# Altium footprint library CADTcommon.PcbLib: 503 footprints (part 17 of 32)
Each footprint in its own frame and in the unit in brackets; x right, y up, seen from the top. Pads: shape width x height; smd on the part's side, far side on the other; paste and mask are expansions set on the pad; w line width, h text height; cw(c..) or ccw(c..) is an arc to the next point about the centre after c.
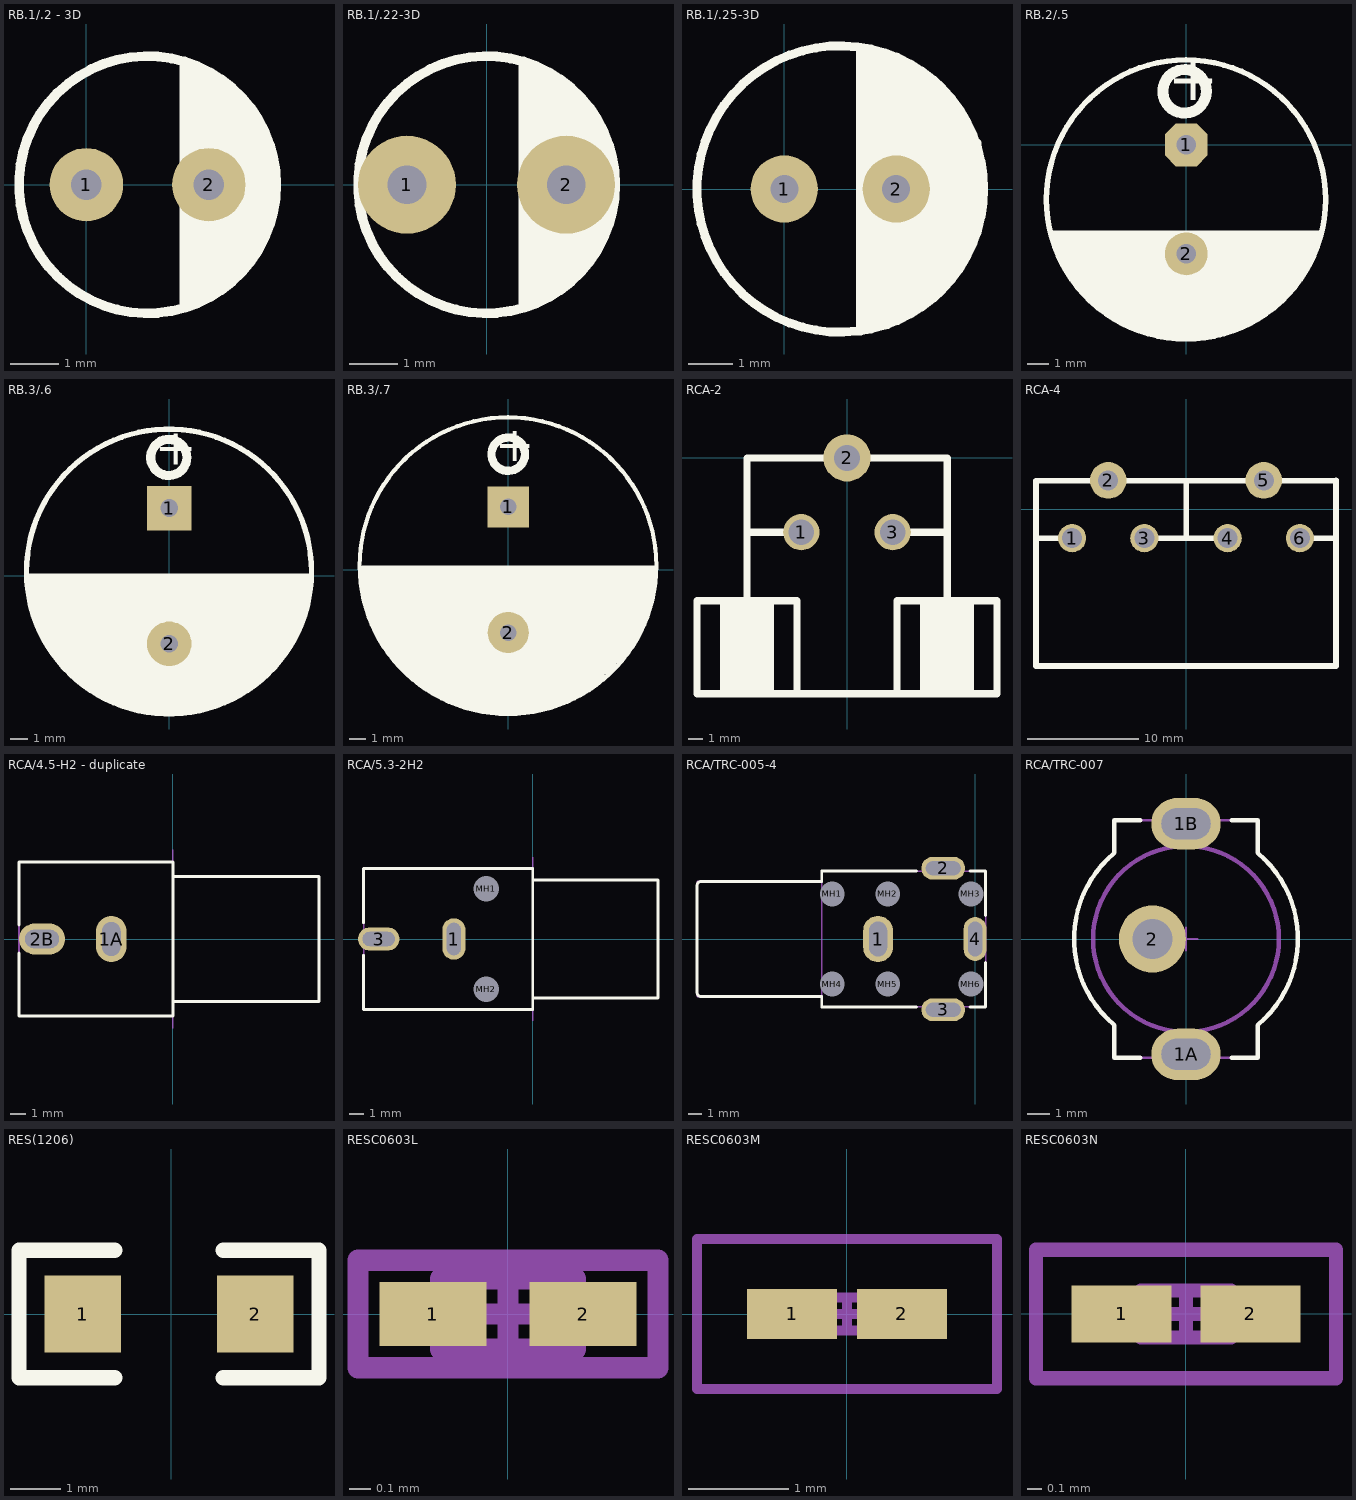
[diagram p16: the footprints below, top view; thin cyan lines are the x and y axes]

## RB.1/.2 - 3D [mil]
pads (2):
  round 60 hole 25: 1(0,0) 2(100,0)
Top Overlay:
  circle w8: c50,0 r105
  lines w8: 80,-100 80,100 ; 85,-95 85,95 ; 90,-90 90,95 ; 95,-90 95,90 ; 100,-90 100,85 ; 100,-85 110,-85 ; 105,-80 105,80 ; 105,85 110,80 110,-80 ; 115,-75 115,75 ; 120,-70 120,70 ; 125,-65 125,65 ; 130,-60 130,65 ; 130,-55 135,-55 ; 135,-50 135,50 135,55 ; 140,-45 140,45 ; 145,-35 145,35 ; 150,-25 150,20
Bottom Overlay:
  lines w8: 70,0 75,0
3D body: height 453.76, standoff -128.81, extent -50.43,-99 148.43,99.85

## RB.1/.22-3D [mil]
pads (2):
  round 80 hole 31.5: 1(-65,0) 2(65,0)
Top Overlay:
  circle w8: c0,0 r105
  lines w8: 30,-100 30,100 ; 35,-95 35,95 ; 40,-90 40,95 ; 45,-90 45,90 ; 50,-90 50,85 ; 50,-85 60,-85 ; 55,-80 55,80 ; 55,85 60,80 60,-80 ; 65,-75 65,75 ; 70,-70 70,70 ; 75,-65 75,65 ; 80,-60 80,65 ; 80,-55 85,-55 ; 85,-50 85,50 85,55 ; 90,-45 90,45 ; 95,-35 95,35 ; 100,-25 100,20
3D body: height 440.94, standoff -740.16, extent -99.43,-100 97.43,96.85

## RB.1/.25-3D [mil]
pads (2):
  round 60 hole 25: 1(0,0) 2(100,0)
Top Overlay:
  circle w8: c50,0 r127.95
  lines w8: 68,-127 68,126 ; 76,-122.05 76,125 ; 76,123 83,123 84,122 84,-123 ; 92,-121 92,120 ; 100,-115 100,118 ; 108,-113 108,113 ; 116,-107 116,109 ; 124,-104 124,103 ; 132,-98 132,98 ; 140,-90 140,90 ; 148,-82 148,81 ; 156,-72 156,71 ; 164,-56 164,57 ; 172,-39 172,41
Bottom Overlay:
  lines w8: 70,0 75,0
3D body: height 512.81, standoff -118.67, extent -78,-122.02 172.03,128.02

## RB.2/.5 [mm]
pads (2):
  oct 2x2 hole 0.9: 1(0,0)
  round 2 hole 0.9: 2(0,-5.08)
Top Overlay:
  circle w0.254: c-0.013,-2.546 r6.5
  circle w0.508: c-0.076,2.489 r1.016
  lines w0.254: -6.274,-4.115 6.172,-4.115 ; -6.248,-4.318 6.172,-4.318 ; -6.121,-4.521 6.071,-4.521 ; -6.096,-4.775 6.045,-4.775 ; -5.944,-5.004 5.893,-5.004 ; -5.817,-5.232 5.817,-5.232 ; -5.715,-5.461 5.69,-5.461 ; -5.664,-5.715 5.563,-5.715 ; -5.461,-5.944 5.461,-5.944 ; -5.385,-6.172 5.359,-6.172 ; -5.156,-6.401 5.156,-6.401 ; -5.029,-6.604 4.978,-6.604 ; -4.801,-6.858 4.826,-6.858 ; -4.623,-7.112 4.547,-7.112 ; -4.267,-7.366 4.242,-7.366 ; -4.039,-7.62 4.013,-7.62 ; -3.607,-7.874 3.658,-7.874 ; -3.251,-8.128 3.226,-8.128 ; -2.819,-8.382 2.819,-8.382 ; -2.286,-8.611 2.235,-8.611 ; -1.524,-8.839 1.549,-8.839
  text "+" at -0.864,1.372 h3.56
3D body: height 25.4, standoff -28.75, extent -6.647,-9.169 6.553,4.031

## RB.3/.6 [mm]
pads (2):
  rect 2.5x2.5 hole 1: 1(0,3.81)
  round 2.5 hole 1: 2(0,-3.81)
Top Overlay:
  circle w0.508: c-0.025,6.655 r1.016
  circle w0.3: c-0.013,0.248 r8
  lines w0.254: -8.001,0 7.925,0
  lines w0.5: -7.823,-0.787 7.798,-0.787 ; -7.798,-0.33 7.823,-0.33 ; -7.747,-1.168 7.696,-1.168 ; -7.671,-1.626 7.62,-1.626 ; -7.569,-2.032 7.493,-2.032 ; -7.417,-2.464 7.366,-2.464 ; -7.29,-2.743 7.264,-2.743 ; -7.137,-3.099 7.061,-3.099 ; -6.858,-3.454 6.883,-3.454 ; -6.604,-3.861 6.68,-3.861 ; -6.426,-4.191 6.477,-4.191 ; -6.198,-4.547 6.248,-4.547 ; -6.045,-4.801 5.994,-4.801 ; -5.664,-5.232 5.639,-5.232 ; -5.156,-5.563 5.334,-5.563 ; -4.877,-5.842 5.004,-5.842 ; -4.496,-6.096 4.674,-6.096 ; -4.039,-6.426 4.267,-6.376 ; -3.556,-6.655 3.861,-6.604 ; -3.099,-6.883 3.302,-6.883 ; -2.565,-7.137 2.591,-7.137 ; -1.753,-7.391 1.956,-7.391
  text "+" at -0.813,5.537 h3.56
3D body: height 25.01, standoff -2.7, extent -7.975,-7.686 8.025,8.255

## RB.3/.7 [mm]
pads (2):
  rect 2.5x2.5 hole 1: 1(0,3.81)
  round 2.5 hole 1: 2(0,-3.81)
Top Overlay:
  circle w0.254: c-0.013,0.248 r9
  circle w0.508: c0,7.01 r1.016
  lines w0.5: -8.8,0 8.8,0 ; -8.775,-0.991 8.7,-0.991 ; -8.698,-1.397 8.6,-1.397 ; -8.648,-1.753 8.6,-1.753 ; -8.521,-2.159 8.5,-2.159 ; -8.368,-2.515 8.357,-2.515 ; -8.216,-2.896 8.255,-2.896 ; -8.103,-3.251 8.077,-3.251 ; -7.886,-3.632 7.925,-3.632 ; -7.759,-4.039 7.671,-4.039 ; -7.505,-4.42 7.391,-4.42 ; -7.301,-4.75 7.264,-4.75 ; -6.971,-5.055 7.01,-5.055 ; -6.768,-5.41 6.731,-5.41 ; -6.438,-5.766 6.35,-5.766 ; -6.158,-6.096 6.096,-6.096 ; -5.777,-6.502 5.664,-6.502 ; -5.295,-6.858 5.283,-6.858 ; -4.787,-7.188 4.851,-7.188 ; -4.253,-7.493 4.343,-7.493 ; -3.644,-7.849 3.632,-7.849 ; -2.907,-8.103 2.946,-8.103 ; -1.917,-8.382 2.007,-8.382
  lines w1: -8.509,-0.483 8.491,-0.483
  text "+" at -0.787,5.893 h3.56
3D body: height 35.51, standoff -2.7, extent -8.983,-8.687 9.017,9.246

## RCA-2 [mm]
pads (3):
  round 2.54 hole 1.8: 1(-3.2,-5.2) 3(3.2,-5.2)
  round 3.3 hole 1.8: 2(0,0)
Top Overlay:
  rectangle: -8.738,-16.5 -5.309,-10
  rectangle: 5.283,-16.5 8.738,-10
  lines w0.254: -8.75,-16.5 -8.75,-10 ; -5.25,-16.5 -5.25,-10 ; 5.25,-16.5 5.25,-10 ; 8.75,-16.5 8.75,-10
  lines w0.508: -7,-5.2 -3.25,-5.2 ; -3.5,-16.5 -3.5,-10 -7,-10 -10.5,-10 -10.5,-16.5 -7,-16.5 ; 3.19,-5.2 7,-5.2 ; 3.5,-16.5 3.5,-10 7,-10 10.5,-10 10.5,-16.5 7.017,-16.5 7.017,0 ; 7,-16.5 -7,-16.5 ; 7,0 -7,0 -7,-16.5
3D body: height 28.01, standoff -4.39, extent -8.371,-19.634 12.029,0.166

## RCA-4 [mm]
pads (6):
  round 2.54 hole 1.8: 1(-10.25,-2.6) 3(-3.75,-2.6) 4(3.75,-2.6) 6(10.25,-2.6)
  round 3.3 hole 1.8: 2(-7,2.6) 5(7,2.6)
Top Overlay:
  lines w0.508: -13.483,-2.6 -10.25,-2.6 ; -3.81,-2.6 3.81,-2.6 ; 0.017,-2.505 0.017,2.575 ; 10.25,-2.6 13.467,-2.6 ; 12.971,2.575 13.479,2.575 ; 13.5,2.575 -13.5,2.575 -13.5,-14.1 13.5,-14.1 13.5,2.6
3D body: height 27.31, standoff -5.59, extent -17.324,-17.231 17.476,2.819

## RCA/4.5-H2 - duplicate [mm] "Two Conductor Jack (RCA), Right Angle, Thru-Hole, Body 10 x 10 x 13 mm (WxTxH)"
height 13
pads (2):
  oval 2x3 hole 1.2 slot 2.2 at 90 deg: 1A(-4,0)
  oval 3x2 hole 1.2 slot 2.2 at 0 deg: 2B(-8.5,0)
Top Overlay:
  lines w0.2: -10,-0.92 -10,-5 0,-5 0,5 -10,5 -10,0.92 ; 0,-4.065 9.5,-4.065 9.5,4.065 0,4.065
Mechanical 1:
  lines w0.1: 0,-5.8 0,5.8
  text "PCB Edge" at -0.333,-4.618 h0.25
Mechanical 13:
  lines w0.1: 0,-4.065 9.5,-4.065 9.5,4.065 0,4.065 ; -10,-5 0,-5 0,5 -10,5 -10,-5
3D body: height 13, standoff 0, extent -9.999,-4.999 -0.001,4.999
3D body: height 10.53, standoff 2.43, extent 0.001,-4.064 9.501,4.049

## RCA/5.3-2H2 [mm] "Two Conductor Jack (RCA), Right Angle, Thru-Hole, Body 10 x 12 x 13 mm (WxTxH)"
height 13
pads (4):
  oval 1.65x2.94 hole 1 slot 2.3 at 90 deg: 1(-5.59,0)
  oval 2.94x1.65 hole 1 slot 2.3 at 0 deg: 3(-10.924,0)
  round 1.5 hole 1.8 unplated: MH1(-3.304,3.556) MH2(-3.304,-3.556)
Top Overlay:
  lines w0.2: -12,-1.15 -12,-5 0,-5 0,5 -12,5 -12,1.15 ; 0,-4.19 8.89,-4.19 8.89,4.19 0,4.19
Mechanical 1:
  lines w0.1: 0,-5.8 0,5.8
  text "PCB Edge" at -0.343,-4.647 h0.25
Mechanical 13:
  lines w0.1: 0,-4.19 8.89,-4.19 8.89,4.19 0,4.19 ; -12,-5 -12,5 0,5 0,-5 -12,-5
3D body: height 10.76, standoff 2.41, extent 0.001,-4.189 8.891,4.174
3D body: height 13, standoff 0, extent -11.999,-4.999 -0.001,4.999

## RCA/TRC-005-4 [mm] "RCA Phono Jack, Right Angle, Thru-Hole, Body 20.8 x 9.8 x 11 mm (LxWxH)"
height 11
pads (10):
  oval 2.15x3.35 hole 1.3 slot 2.5 at 90 deg: 1(-7,0)
  oval 3.15x1.65 hole 1 slot 2.5 at 0 deg: 2(-2.3,5.1) 3(-2.3,-5.1)
  oval 1.65x3.15 hole 1 slot 2.5 at 90 deg: 4(0,0)
  round 1.5 hole 1.8 unplated: MH1(-10.3,3.25) MH2(-6.3,3.25) MH3(-0.3,3.25) MH4(-10.3,-3.25) MH5(-6.3,-3.25) MH6(-0.3,-3.25)
Top Overlay:
  lines w0.2: -4.235,-4.9 -11.05,-4.9 -11.05,-4.15 -19.75,-4.15 cw(c-19.75,-3.85) -20.05,-3.85 -20.05,3.85 cw(c-19.75,3.85) -19.75,4.15 -11.05,4.15 -11.05,4.9 -4.235,4.9 ; -0.365,-4.9 0.75,-4.9 0.75,-1.69 ; -0.365,4.9 0.75,4.9 0.75,1.69
Mechanical 13:
  lines w0.1: -11.05,4.15 -20.05,4.15 -20.05,-4.15 -11.05,-4.15 -11.05,-4.9 ; -11.05,-4.9 -11.05,4.9 0.75,4.9 0.75,-4.9 -11.05,-4.9
3D body: height 11, standoff 0, extent -11.049,-4.899 0.749,4.899
3D body: height 9.12, standoff 0.85, extent -20.049,-4.149 -11.049,4.134

## RCA/TRC-007 [mm] "RCA Socket, Vertical, Thru-Hole, Body 10.6 x 10 x 15 mm (LxWxH)"
height 15
pads (3):
  oval 3.1x2.3 hole 1.4 slot 2.2 at 0 deg: 1A(0,-5.15) 1B(0,5.15)
  round 3 hole 1.8: 2(-1.5,0)
Top Overlay:
  lines w0.2: -3.221,-3.825 cw(c0,0) -3.221,3.825 ; -3.2,-3.845 -3.2,-5.3 ; -3.2,3.845 -3.2,5.3 -2.05,5.3 ; 2.05,-5.3 3.2,-5.3 3.2,-3.845 ; 2.05,5.3 3.2,5.3 3.2,3.845 ; 3.221,-3.825 ccw(c0,0) 3.221,3.825 ; -3.2,-5.3 -2.05,-5.3 -3.2,-5.3
Mechanical 13:
  circle w0.2: c0,0 r4.15
  lines w0.1: -3.221,-3.825 cw(c0,0) -3.209,3.835 ; -3.2,-3.825 -3.2,-5.3 3.2,-5.3 3.2,-3.825 ; -3.2,3.825 -3.2,5.3 3.2,5.3 3.2,3.825 ; 3.209,-3.835 ccw(c0,0) 3.209,3.835
Mechanical 15:
  lines w0.1: -0.5,0 0.5,0 ; 0,-0.5 0,0.5
3D body: height 15, standoff 0, extent -4.158,-4.158 4.158,4.158

## RES(1206) [mil]
pads (2):
  rect 60x60 smd: 1(-69.33,0.3) 2(65.67,0.3)
Top Overlay:
  lines w12: -44.33,-49.7 -119.33,-49.7 -119.33,50.3 -44.33,50.3 ; 40.67,-49.7 115.67,-49.7 115.67,50.3 40.67,50.3

## RESC0603L [mm] "Chip Resistor, Body 0.6x0.3mm, IPC High Density"
height 0.3
pads (2):
  rect 0.5x0.3 smd: 1(-0.35,0) 2(0.35,0)
Mechanical 13:
  lines w0.1: -0.315,-0.165 0.315,-0.165 0.315,0.165 -0.315,0.165 -0.315,-0.165
Mechanical 15:
  lines w0.1: -0.165,0 0.165,0 ; 0,-0.165 0,0.165 ; -0.7,-0.25 0.7,-0.25 0.7,0.25 -0.7,0.25 -0.7,-0.25
3D body: height 0.3, standoff 0, extent -0.315,-0.165 0.315,0.165

## RESC0603M [mm] "Chip Resistor, Body 0.6x0.3mm, IPC Low Density"
height 0.3
pads (2):
  rect 0.9x0.5 smd: 1(-0.55,0) 2(0.55,0)
Mechanical 13:
  lines w0.1: -0.315,-0.165 0.315,-0.165 0.315,0.165 -0.315,0.165 -0.315,-0.165
Mechanical 15:
  lines w0.1: -0.165,0 0.165,0 ; 0,-0.165 0,0.165 ; -1.5,-0.75 1.5,-0.75 1.5,0.75 -1.5,0.75 -1.5,-0.75
3D body: height 0.3, standoff 0, extent -0.315,-0.165 0.315,0.165

## RESC0603N [mm] "Chip Resistor, Body 0.6x0.3mm, IPC Medium Density"
height 0.3
pads (2):
  rect 0.7x0.4 smd: 1(-0.45,0) 2(0.45,0)
Mechanical 13:
  lines w0.1: -0.315,-0.165 -0.315,0.165 0.315,0.165 0.315,-0.165 -0.315,-0.165
Mechanical 15:
  lines w0.1: -0.165,0 0.165,0 ; 0,-0.165 0,0.165 ; -1.05,-0.45 -1.05,0.45 1.05,0.45 1.05,-0.45 -1.05,-0.45
3D body: height 0.3, standoff 0, extent -0.315,-0.165 0.315,0.165